# Altium footprint library standard-graphic-logo.PcbLib: 58 footprints (part 3 of 4)
Each footprint in its own frame and in the unit in brackets; x right, y up, seen from the top. Pads: shape width x height; smd on the part's side, far side on the other; paste and mask are expansions set on the pad; w line width, h text height; cw(c..) or ccw(c..) is an arc to the next point about the centre after c.
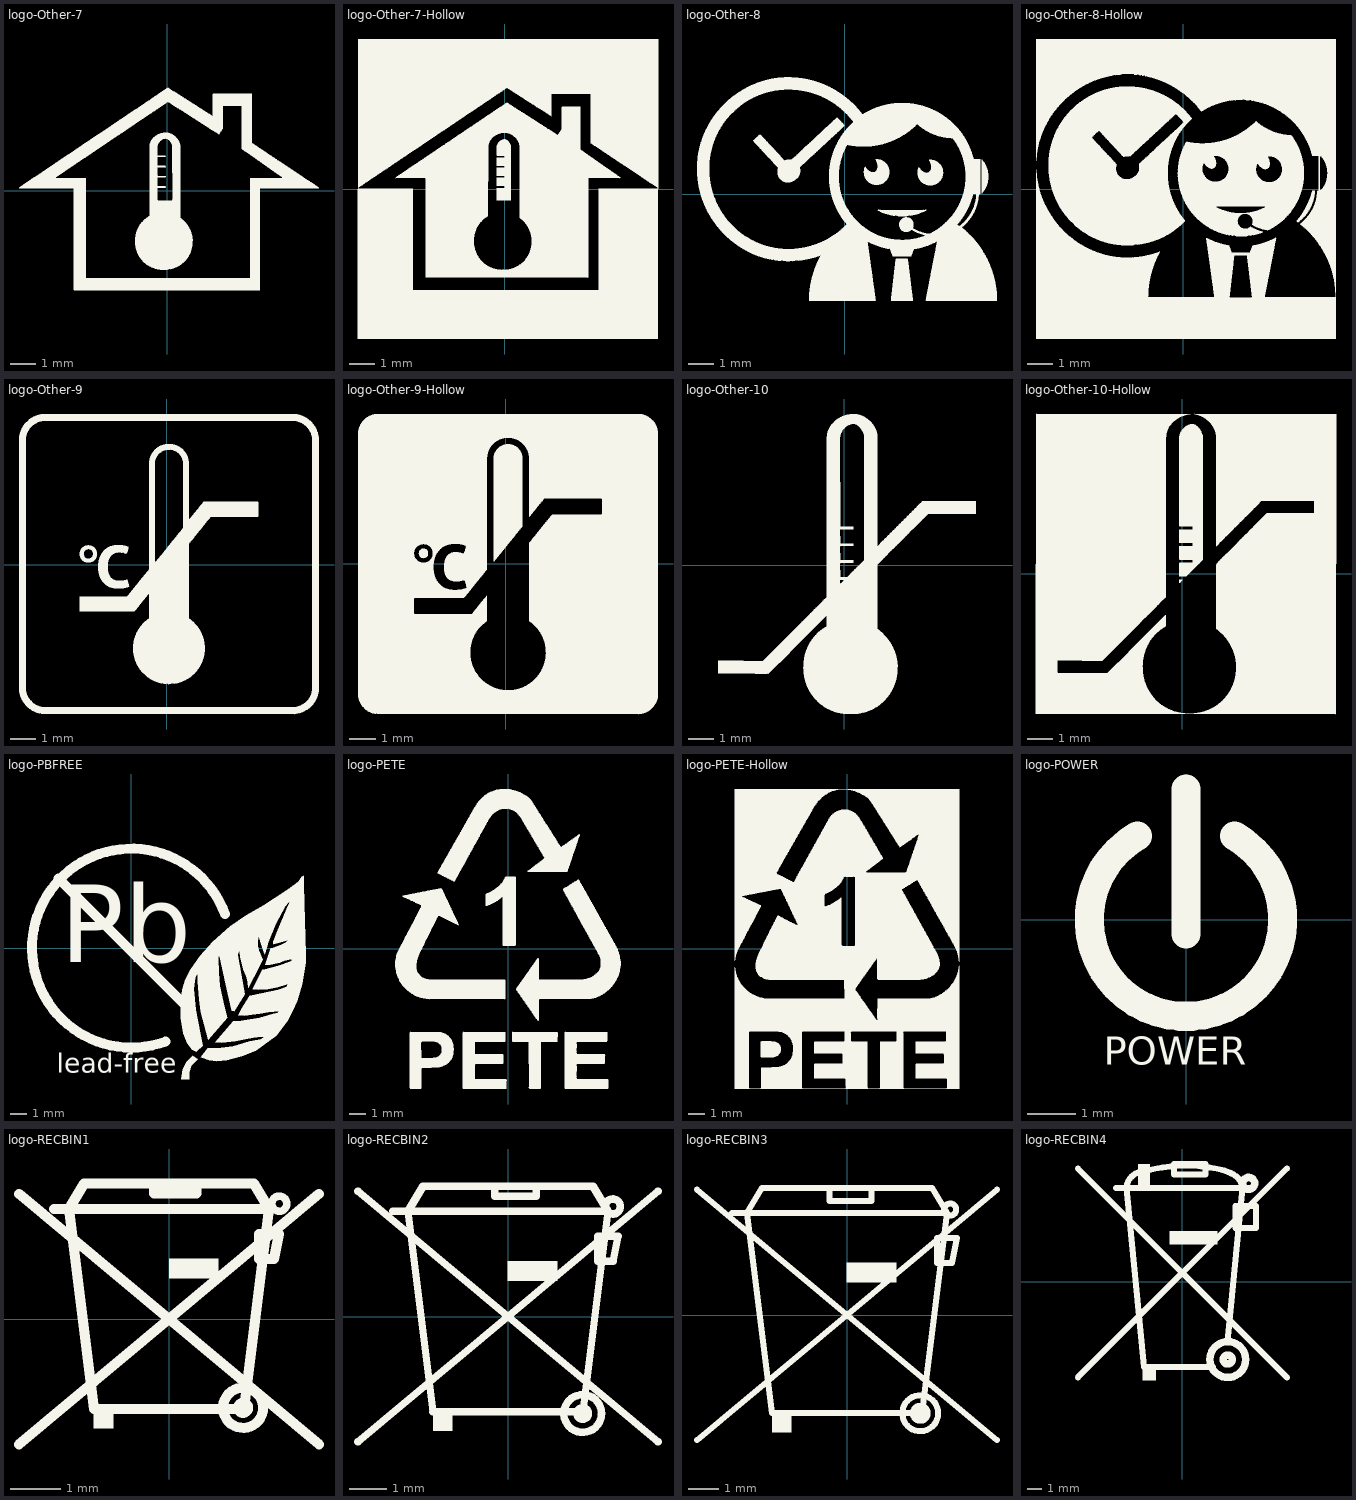
[diagram p2: the footprints below, top view; thin cyan lines are the x and y axes]

## logo-Other-7 [mm]
Top Overlay:
  drawing of 2 lines, arcs and shapes, not listed
  text "TarahiBoard.com" at 0.274,-3.79 h0.1

## logo-Other-7-Hollow [mm]
Top Overlay:
  drawing of 3 lines, arcs and shapes, not listed
  text "TarahiBoard.com" at -1.377,-4.679 h0.1

## logo-Other-8 [mm]
Top Overlay:
  drawing of 7 lines, arcs and shapes, not listed
  text "TarahiBoard.com" at -0.869,-2.266 h0.1

## logo-Other-8-Hollow [mm]
Top Overlay:
  drawing of 4 lines, arcs and shapes, not listed
  text "TarahiBoard.com" at -4.933,-5.187 h0.1

## logo-Other-9 [mm]
Top Overlay:
  drawing of 4 lines, arcs and shapes, not listed
  text "TarahiBoard.com" at -0.615,-3.409 h0.1

## logo-Other-9-Hollow [mm]
Top Overlay:
  drawing of 3 lines, arcs and shapes, not listed
  text "TarahiBoard.com" at 2.687,0.274 h0.1

## logo-Other-10 [mm]
Top Overlay:
  drawing of 1 lines, arcs and shapes, not listed
  text "TarahiBoard.com" at -0.615,-4.044 h0.1

## logo-Other-10-Hollow [mm]
Top Overlay:
  drawing of 3 lines, arcs and shapes, not listed
  text "TarahiBoard.com" at 3.068,-0.869 h0.1

## logo-PBFREE [mm]
Top Overlay:
  drawing of 4 lines, arcs and shapes, not listed
  text "Pb" at -4.3,-2.4 h8
  text "lead-free" at -4.5,-7.9 h2
  text "TarahiBoard.com" at 0.742,0.909 h0.1

## logo-PETE [mm]
Top Overlay:
  drawing of 8 lines, arcs and shapes, not listed

## logo-PETE-Hollow [mm]
Top Overlay:
  drawing of 2 lines, arcs and shapes, not listed

## logo-POWER [mm]
Top Overlay:
  lines w0.6: -1,1.732 ccw(c0,0) 1,1.732 ; 0,-0.3 0,2.7
  text "TarahiBoard.com" at 0.107,-0.107 h0.1
  text "POWER" at -1.7,-3.2 h1

## logo-RECBIN1 [mm]
Top Overlay:
  circle w0.2: c1.477,-1.771 r0.1
  circle w0.2: c1.477,-1.771 r0.4
  circle w0.15: c2.2,2.3 r0.15
  region: 0,1.2 0.98,1.2 0.98,0.817 0,0.817
  region: -1.496,-1.798 -1.113,-1.798 -1.113,-2.181 -1.496,-2.181
  lines w0.2: -2.991,-2.498 2.991,2.498 ; -2.991,2.498 2.991,-2.498 ; -2.293,2.199 1.994,2.199 ; -0.3,2.617 -0.3,2.5 0.544,2.5 0.544,2.656 ; 1.994,2.199 1.496,-1.798 -1.496,-1.798 -1.994,2.199 -1.695,2.698 1.695,2.698 1.994,2.199 ; 1.795,1.2 1.795,1.699 2.193,1.699 2.094,1.2 1.795,1.2
  text "TarahiBoard.com" at -0.582,2.132 h0.1

## logo-RECBIN2 [mm]
Top Overlay:
  circle w0.2: c2.777,2.929 r0.2
  circle w0.2: c1.977,-2.571 r0.5
  circle w0.2: c1.977,-2.571 r0.15
  region: -2,-2.521 -1.491,-2.521 -1.491,-3.032 -2,-3.032
  region: -0.007,1.472 1.299,1.472 1.299,0.961 -0.007,0.961
  lines w0.2: -3.993,-3.321 3.978,3.334 ; -3.993,3.334 3.978,-3.321 ; -3.063,2.803 2.649,2.803 ; -1.491,-2.521 -2,-2.521 ; -0.356,3.417 -0.356,3.2 0.744,3.2 0.744,3.456 ; -2,-2.521 1.985,-2.521 2.649,2.803 ; -2,-2.521 -2.664,2.803 -2.266,3.468 2.251,3.468 2.649,2.803 ; 2.384,1.472 2.782,1.472 2.915,2.137 2.384,2.137 2.384,1.472
  text "TarahiBoard.com" at -0.467,2.717 h0.1

## logo-RECBIN3 [mm]
Top Overlay:
  circle w0.2: c3.432,3.529 r0.2
  circle w0.2: c2.432,-3.271 r0.6
  circle w0.3: c2.432,-3.271 r0.2
  region: -0.013,1.747 1.629,1.747 1.629,1.106 -0.013,1.106
  region: -2.516,-3.271 -1.877,-3.271 -1.877,-3.912 -2.516,-3.912
  lines w0.2: -5.02,-4.171 4.995,4.192 ; -5.02,4.192 4.995,-4.171 ; -3.852,3.419 3.326,3.419 ; -1.877,-3.271 -2.516,-3.271 ; -0.6,4.217 -0.6,3.817 0.8,3.817 0.8,4.256 ; -2.516,-3.271 -3.351,3.419 -2.85,4.256 2.825,4.256 3.326,3.419 ; -2.516,-3.271 2.491,-3.271 3.326,3.419 ; 2.992,1.747 2.992,2.583 3.659,2.583 3.493,1.747 2.992,1.747
  text "TarahiBoard.com" at 0.02,1.29 h0.1

## logo-RECBIN4 [mm]
Top Overlay:
  circle w0.5: c3.041,-5.2 r1.2
  circle w0.5: c3.041,-5.2 r0.3
  circle w0.5: c4.441,6.6 r0.4
  rectangle: -2.959,6.3 -2.159,7.9
  rectangle: -2.659,-6.6 -1.759,-5.7
  rectangle: -0.859,2.5 2.341,3.4
  lines w0.4: -7,-6.4 7,7.6 ; -7,7.6 7,-6.4 ; -4.459,6.3 4.641,6.3 ; -3.759,6.2 cw(c-2.559,6.2) -2.969,7.328 ; -3.759,6.3 -2.559,-5.7 2.041,-5.7 ; -2.347,7.459 cw(c0.241,-2.2) 2.83,7.459 3.241,7.3 ; 3.012,-3.997 4.041,6.3 ; 3.252,7.278 cw(c2.841,6.15) 4.041,6.15 ; -0.559,7.2 1.541,7.2 1.541,7.9 -0.559,7.9 -0.559,7.2 ; 3.541,3.6 4.941,3.6 4.941,5.1 3.541,5.1 3.541,3.6
  text "TarahiBoard.com" at 0.147,2.687 h0.1